# Altium footprint library sun_library.PcbLib: 412 footprints (part 5 of 26)
Each footprint in its own frame and in the unit in brackets; x right, y up, seen from the top. Pads: shape width x height; smd on the part's side, far side on the other; paste and mask are expansions set on the pad; w line width, h text height; cw(c..) or ccw(c..) is an arc to the next point about the centre after c.
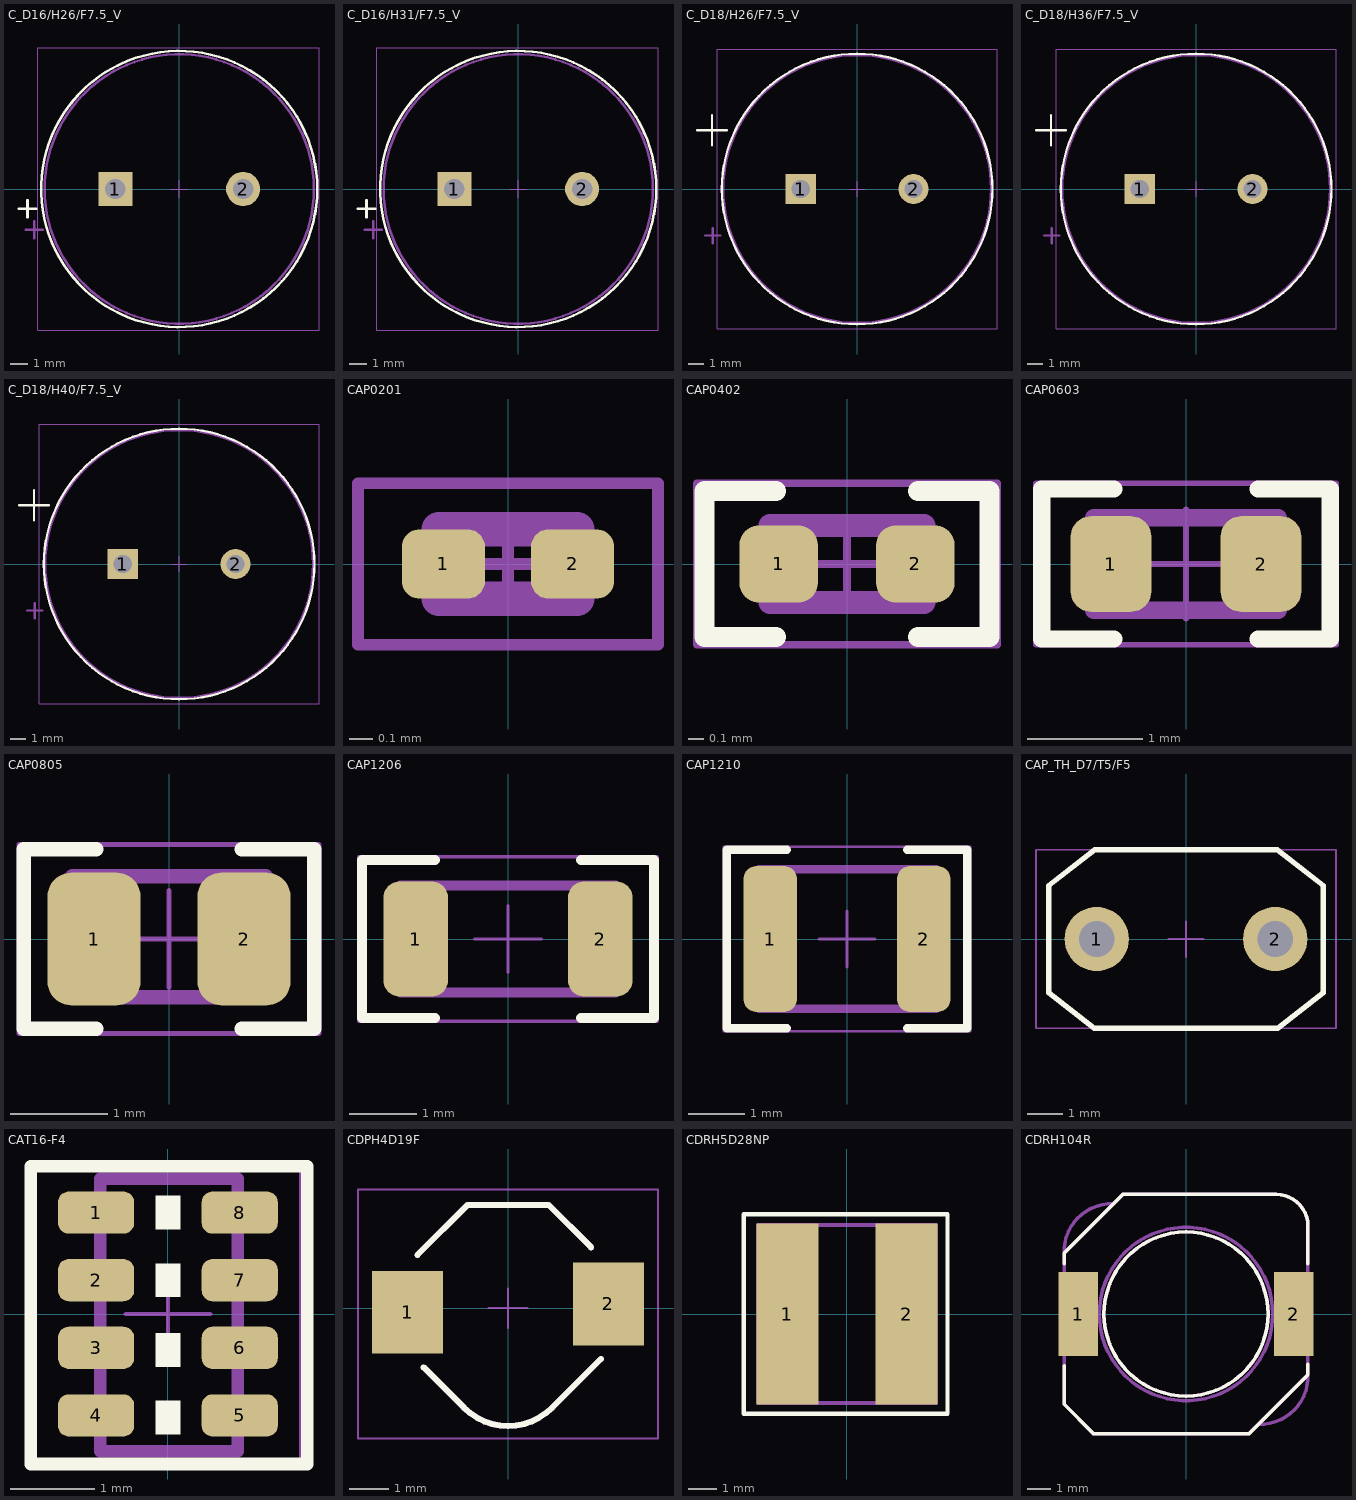
[diagram p4: the footprints below, top view; thin cyan lines are the x and y axes]

## C_D16/H26/F7.5_V [mm]
pads (2):
  rect 2x2 hole 1.2: 1(-3.75,0)
  round 2 hole 1.2: 2(3.75,0)
Top Overlay:
  circle w0.15: c0,0 r8.1
  lines w0.15: -9.4,-1.15 -8.4,-1.15 ; -8.9,-1.65 -8.9,-0.65
TopAssy 13:
  circle w0.15: c0,0 r7.9
  lines w0.15: -9,-2.4 -8,-2.4 ; -8.5,-2.9 -8.5,-1.9
CourtTop 15:
  lines w0.05: -0.5,0 0.5,0 ; 0,-0.5 0,0.5 ; -8.3,-8.3 8.2,-8.3 8.2,8.3 -8.3,8.3 -8.3,-8.3
3D body "User Library-Cap-EL(16x26-7_5).step": height 26.01, standoff -4.29, extent -8,-7.999 8.002,7.995

## C_D16/H31/F7.5_V [mm]
pads (2):
  rect 2x2 hole 1.2: 1(-3.75,0)
  round 2 hole 1.2: 2(3.75,0)
Top Overlay:
  circle w0.15: c0,0 r8.1
  lines w0.15: -9.4,-1.15 -8.4,-1.15 ; -8.9,-1.65 -8.9,-0.65
TopAssy 13:
  circle w0.15: c0,0 r7.9
  lines w0.15: -9,-2.4 -8,-2.4 ; -8.5,-2.9 -8.5,-1.9
CourtTop 15:
  lines w0.05: -0.5,0 0.5,0 ; 0,-0.5 0,0.5 ; -8.3,-8.3 8.2,-8.3 8.2,8.3 -8.3,8.3 -8.3,-8.3
3D body "User Library-Cap-EL(16x31_5-7_5)T.step": height 41.02, standoff -2.99, extent -8,-8.002 8.002,7.998

## C_D18/H26/F7.5_V [mm] "Capacitor Body Dia. 18mm, Lead space 7.5mm, Lead dia. 0.8mm"
height 26
pads (2):
  rect 2x2 hole 1.2: 1(-3.75,0)
  round 2 hole 1.2: 2(3.75,0)
Top Overlay:
  circle w0.15: c0,0 r9
  lines w0.15: -10.65,3.9 -8.65,3.9 ; -9.65,2.9 -9.65,4.9
TopAssy 13:
  circle w0.15: c0,0 r8.9
  lines w0.15: -10.1,-3.1 -9.1,-3.1 ; -9.6,-3.6 -9.6,-2.6
CourtTop 15:
  lines w0.05: -0.5,0 0.5,0 ; 0,-0.5 0,0.5 ; -9.3,-9.3 9.3,-9.3 9.3,9.3 -9.3,9.3 -9.3,-9.3
3D body "User Library-Cap-EL(18x26-7_5)T.step": height 26.75, standoff -3.25, extent -9,-9.001 9.002,8.997

## C_D18/H36/F7.5_V [mm] "Capacitor Body Dia. 18mm, Lead space 7.5mm, Lead dia. 0.8mm"
height 35.5
pads (2):
  rect 2x2 hole 1.2: 1(-3.75,0)
  round 2 hole 1.2: 2(3.75,0)
Top Overlay:
  circle w0.15: c0,0 r9
  lines w0.15: -10.65,3.9 -8.65,3.9 ; -9.65,2.9 -9.65,4.9
TopAssy 13:
  circle w0.15: c0,0 r8.9
  lines w0.15: -10.1,-3.1 -9.1,-3.1 ; -9.6,-3.6 -9.6,-2.6
CourtTop 15:
  lines w0.05: -0.5,0 0.5,0 ; 0,-0.5 0,0.5 ; -9.3,-9.3 9.3,-9.3 9.3,9.3 -9.3,9.3 -9.3,-9.3
3D body "User Library-Cap-EL(18x36-7_5)T.step": height 36.75, standoff -3.25, extent -9,-9.002 9.002,8.998

## C_D18/H40/F7.5_V [mm] "Capacitor Body Dia. 18mm, Lead space 7.5mm, Lead dia. 0.8mm"
height 35.5
pads (2):
  rect 2x2 hole 1.2: 1(-3.75,0)
  round 2 hole 1.2: 2(3.75,0)
Top Overlay:
  circle w0.15: c0,0 r9
  lines w0.15: -10.65,3.9 -8.65,3.9 ; -9.65,2.9 -9.65,4.9
TopAssy 13:
  circle w0.15: c0,0 r8.9
  lines w0.15: -10.1,-3.1 -9.1,-3.1 ; -9.6,-3.6 -9.6,-2.6
CourtTop 15:
  lines w0.05: -0.5,0 0.5,0 ; 0,-0.5 0,0.5 ; -9.3,-9.3 9.3,-9.3 9.3,9.3 -9.3,9.3 -9.3,-9.3
3D body "User Library-Cap-EL(18x40-7_5)T.step": height 41.02, standoff -2.99, extent -9,-9.002 9.002,8.998

## CAP0201 [mm] "Chip Capacitor Body 0.6x0.3mm, IPC High Density"
height 0.3
pads (2):
  rrect50% 0.36x0.3 smd paste-0.01 mask+0.05: 1(-0.28,0) 2(0.28,0)
TopAssy 13:
  lines w0.15: -0.3,-0.15 -0.3,0.15 0.3,0.15 0.3,-0.15 -0.3,-0.15
CourtTop 15:
  lines w0.05: -0.2,0 0.2,0 ; 0,-0.2 0,0.2 ; -0.65,-0.35 -0.65,0.35 0.65,0.35 0.65,-0.35 -0.65,-0.35
3D body "User Library-0201(0603M) Cap.step": height 0.31, standoff 0, extent -0.305,-0.152 0.305,0.153

## CAP0402 [mm] "Chip Capacitor Body 1.0x0.5mm, IPC High Density"
height 0.5
pads (2):
  rrect50% 0.51x0.5 smd paste-0.02 mask+0.05: 1(-0.445,0) 2(0.445,0)
Top Overlay:
  lines w0.13: -0.462,-0.475 -0.925,-0.475 -0.925,0.475 -0.462,0.475 ; 0.462,-0.475 0.925,-0.475 0.925,0.475 0.462,0.475
TopAssy 13:
  lines w0.15: -0.5,-0.25 0.5,-0.25 0.5,0.25 -0.5,0.25 -0.5,-0.25
CourtTop 15:
  lines w0.05: -0.3,0 0.3,0 ; 0,-0.3 0,0.3 ; -0.975,-0.525 0.975,-0.525 0.975,0.525 -0.975,0.525 -0.975,-0.525
3D body "User Library-0402(1005M) Cap.step": height 0.51, standoff 0, extent -0.508,-0.254 0.508,0.254

## CAP0603 [mm] "Chip Capacitor, Body 1.6x0.8mm, IPC High Density"
height 0.8
pads (2):
  rrect50% 0.7x0.83 smd paste-0.05 mask+0.075: 1(-0.65,0) 2(0.65,0)
Top Overlay:
  lines w0.15: -0.625,-0.65 -1.25,-0.65 -1.25,0.65 -0.625,0.65 ; 0.625,-0.65 1.25,-0.65 1.25,0.65 0.625,0.65
TopAssy 13:
  lines w0.15: -0.8,-0.4 -0.8,0.4 0.8,0.4 0.8,-0.4 -0.8,-0.4
CourtTop 15:
  lines w0.05: -0.475,0 0.475,0 ; 0,-0.475 0,0.475 ; -1.3,-0.7 -1.3,0.7 1.3,0.7 1.3,-0.7 -1.3,-0.7
3D body "User Library-CapCeramic_Kemet_0603_1608.step": height 0.8, standoff 0, extent -0.8,-0.4 0.8,0.4

## CAP0805 [mm] "Chip Capacitor, Body 2.0x1.3mm, IPC High Density"
height 0.85
pads (2):
  rrect50% 0.96x1.37 smd: 1(-0.775,0) 2(0.775,0)
Top Overlay:
  lines w0.15: -0.75,-0.925 -1.5,-0.925 -1.5,0.925 -0.75,0.925 ; 0.75,-0.925 1.5,-0.925 1.5,0.925 0.75,0.925
TopAssy 13:
  lines w0.15: -1,-0.6 -1,0.65 1,0.65 1,-0.6 -1,-0.6
CourtTop 15:
  lines w0.05: -0.5,0 0.5,0 ; 0,-0.5 0,0.5 ; -1.55,-0.975 -1.55,0.975 1.55,0.975 1.55,-0.975 -1.55,-0.975
3D body "SW3dPS-0805 SMD Capacitor.STEP": height 0.78, standoff 0, extent -1,-0.625 1,0.625

## CAP1206 [mm] "Chip Capacitor, Body 3.2x1.6mm, IPC High Density"
height 1.25
pads (2):
  rrect50% 0.96x1.72 smd: 1(-1.375,0) 2(1.375,0)
Top Overlay:
  lines w0.15: -1.088,-1.175 -2.175,-1.175 -2.175,1.175 -1.088,1.175 ; 1.088,-1.175 2.175,-1.175 2.175,1.175 1.088,1.175
TopAssy 13:
  lines w0.15: -1.6,-0.8 -1.6,0.8 1.6,0.8 1.6,-0.8 -1.6,-0.8
CourtTop 15:
  lines w0.05: -0.5,0 0.5,0 ; 0,-0.5 0,0.5 ; -2.225,-1.225 -2.225,1.225 2.225,1.225 2.225,-1.225 -2.225,-1.225
3D body "SW3dPS-1206 SMD Capacitor.STEP": height 1, standoff 0, extent -1.6,-0.8 1.6,0.8

## CAP1210 [mm] "Chip Capacitor, Body 3.2x2.5mm, IPC High Density"
height 1.9
pads (2):
  rrect50% 0.96x2.62 smd: 1(-1.375,0) 2(1.375,0)
Top Overlay:
  lines w0.15: -1.075,-1.6 -2.15,-1.6 -2.15,1.6 -1.075,1.6 ; 1.075,-1.6 2.15,-1.6 2.15,1.6 1.075,1.6
TopAssy 13:
  lines w0.15: -1.575,-1.25 1.6,-1.25 1.6,1.25 -1.575,1.25 -1.575,-1.25
CourtTop 15:
  lines w0.05: -0.5,0 0.5,0 ; 0,-0.5 0,0.5 ; -2.2,-1.65 -2.2,1.65 2.2,1.65 2.2,-1.65 -2.2,-1.65
3D body "User Library-SMD CAPACITOR_1210.step": height 0.79, standoff 0.01, extent -1.6,-1.25 1.6,1.25

## CAP_TH_D7/T5/F5 [mm] "CAP X1Y2"
height 10
pads (2):
  round 1.8 hole 1: 1(-2.5,0) 2(2.5,0)
Top Overlay:
  lines w0.15: -3.847,-1.508 -2.567,-2.5 2.567,-2.5 3.847,-1.508 3.847,1.499 2.554,2.5 -2.554,2.5 -3.847,1.499 -3.847,-1.508
CourtTop 15:
  lines w0.05: -0.5,0 0.5,0 ; 0,-0.5 0,0.5 ; -4.2,-2.5 4.2,-2.5 4.2,2.5 -4.2,2.5 -4.2,-2.5
3D body "User Library-Disc_CAP d6x3_5_5mm.step": height 8.11, standoff -2.01, extent -3,-1.05 3,1.05

## CAT16-F4 [mm] "Chip resistor arrays"
height 0.6
pads (8):
  rrect50% 0.9x0.5 smd: 1(-0.85,1.2) 2(-0.85,0.4) 3(-0.85,-0.4) 4(-0.85,-1.2) 5(0.85,-1.2) 6(0.85,-0.4) 7(0.85,0.4) 8(0.85,1.2)
Top Overlay:
  rectangle: -0.15,1 0.15,1.4
  rectangle: -0.15,0.2 0.15,0.6
  rectangle: -0.15,-0.625 0.15,-0.225
  rectangle: -0.15,-1.425 0.15,-1.025
  lines w0.15: -1.625,-1.775 -1.625,1.75 1.65,1.75 1.65,-1.775 -1.625,-1.775
TopAssy 13:
  lines w0.15: -0.8,-1.325 -0.525,-1.325 -0.525,-1.1 -0.8,-1.1 ; -0.8,0.275 -0.525,0.275 -0.525,0.5 -0.8,0.5 ; -0.8,1.075 -0.525,1.075 -0.525,1.3 -0.8,1.3 ; -0.775,-0.525 -0.5,-0.525 -0.5,-0.3 -0.775,-0.3 ; 0.8,0.288 0.525,0.288 0.525,0.513 0.8,0.512 ; 0.825,-1.337 0.55,-1.337 0.55,-1.112 0.825,-1.112 ; 0.825,-0.512 0.55,-0.512 0.55,-0.288 0.825,-0.288 ; 0.825,1.088 0.55,1.088 0.55,1.312 0.825,1.312 ; -0.8,-1.625 0.825,-1.625 0.825,1.6 -0.8,1.6 -0.8,-1.625
CourtTop 15:
  lines w0.05: -0.5,0 0.5,0 ; 0,-0.5 0,0.5 ; -1.575,-1.775 -1.575,1.775 1.575,1.775 1.575,-1.775 -1.575,-1.775
3D body "User Library-Array-1206-4Way-Var2-1.STEP": height 0.5, standoff 0, extent -0.8,-1.6 0.8,1.6

## CDPH4D19F [mm] "SMT power inductors, CDPH4D19F seriesSUMIDA"
height 2
pads (2):
  rect 1.8x2.1 smd: 1(-2.544,-0.106) 2(2.544,0.106)
Top Overlay:
  lines w0.15: -2.296,1.344 -1.024,2.616 1.027,2.616 2.105,1.538 ; -2.137,-1.503 -1.112,-2.528 ccw(c0.002,-1.414) 1.115,-2.528 2.353,-1.29
TopAssy 13:
  lines w0.15: -2.296,1.344 -1.024,2.616 1.027,2.616 2.105,1.538 ; -2.137,-1.503 -1.112,-2.528 ccw(c0.002,-1.414) 1.115,-2.528 2.353,-1.29
CourtTop 15:
  lines w0.05: -0.5,0 0.5,0 ; 0,-0.5 0,0.5 ; -3.8,-3.3 -3.8,3 3.8,3 3.8,-3.3 -3.8,-3.3
3D body "User Library-Sumida_CDPH4D19FNP-100MC.step": height 1.9, standoff -0.03, extent -3.463,-3.465 3.467,3.465

## CDRH5D28NP [mm] "Shielded Power Inductors SUMIDA"
height 3
pads (2):
  rect 2.15x6.3 smd: 1(-2.075,0) 2(2.075,0)
Top Overlay:
  lines w0.15: -3.6,-3.475 3.5,-3.475 3.5,3.475 -3.6,3.475 -3.6,-3.475
TopAssy 13:
  region: 1.2,2.8 2.8,2.8 2.8,-2.8 1.2,-2.8
  region: -2.8,2.8 -1.2,2.8 -1.2,-2.8 -2.8,-2.8
  lines w0.15: -3.1,-3.1 -3.1,3.1 3.1,3.1 3.1,-3.1 -3.1,-3.1
3D body "User Library-cdrh5d28.step": height 3, standoff 0, extent -3,-3 3,3

## CDRH104R [mm]
pads (2):
  rect 1.7x3.6 smd: 1(-4.6,0) 2(4.6,0)
Top Overlay:
  circle w0.15: c0,0 r3.5
  lines w0.15: -5.2,-2.2 -5.2,-3.85 -3.95,-5.1 2.7,-5.1 5.2,-2.6 5.2,-2.15 ; -5.2,2.15 -5.2,2.6 -2.7,5.1 3.85,5.1 cw(c3.85,3.75) 5.2,3.75 5.2,2.15
TopAssy 13:
  circle w0.15: c0,0 r3.5
  circle w0.15: c0,0 r3.7
  lines w0.15: -5.2,2.601 cw(c-3.175,2.675) -3.101,4.7 ; 3.097,-4.7 ccw(c3.175,-2.675) 5.2,-2.597 ; 5.2,-1.5 5.2,1.5 4,1.5 4,-1.5 5.2,-1.5 ; 5.2,-1.5 5.2,-2.6 2.7,-5.1 -3.95,-5.1 -5.2,-3.85 -5.2,-1.8 -5.2,-1.75 -5.2,1.75 -5.2,1.8 -5.2,2.6 -2.7,5.1 3.85,5.1 cw(c3.85,3.75) 5.2,3.75 5.2,1.8 5.2,1.2 5.2,0.25 5.2,-1.5 ; -5.2,-1.5 -5.2,1.5 -4,1.5 -4,-1.5 -5.2,-1.5
3D body "User Library-cdrh104r.STEP": height -0.5, standoff -4.5, extent -5.275,-5.2 5.225,5.1